# Altium footprint library Connectors THD.PcbLib: 631 footprints (part 27 of 46)
Each footprint in its own frame and in the unit in brackets; x right, y up, seen from the top. Pads: shape width x height; smd on the part's side, far side on the other; paste and mask are expansions set on the pad; w line width, h text height; cw(c..) or ccw(c..) is an arc to the next point about the centre after c.
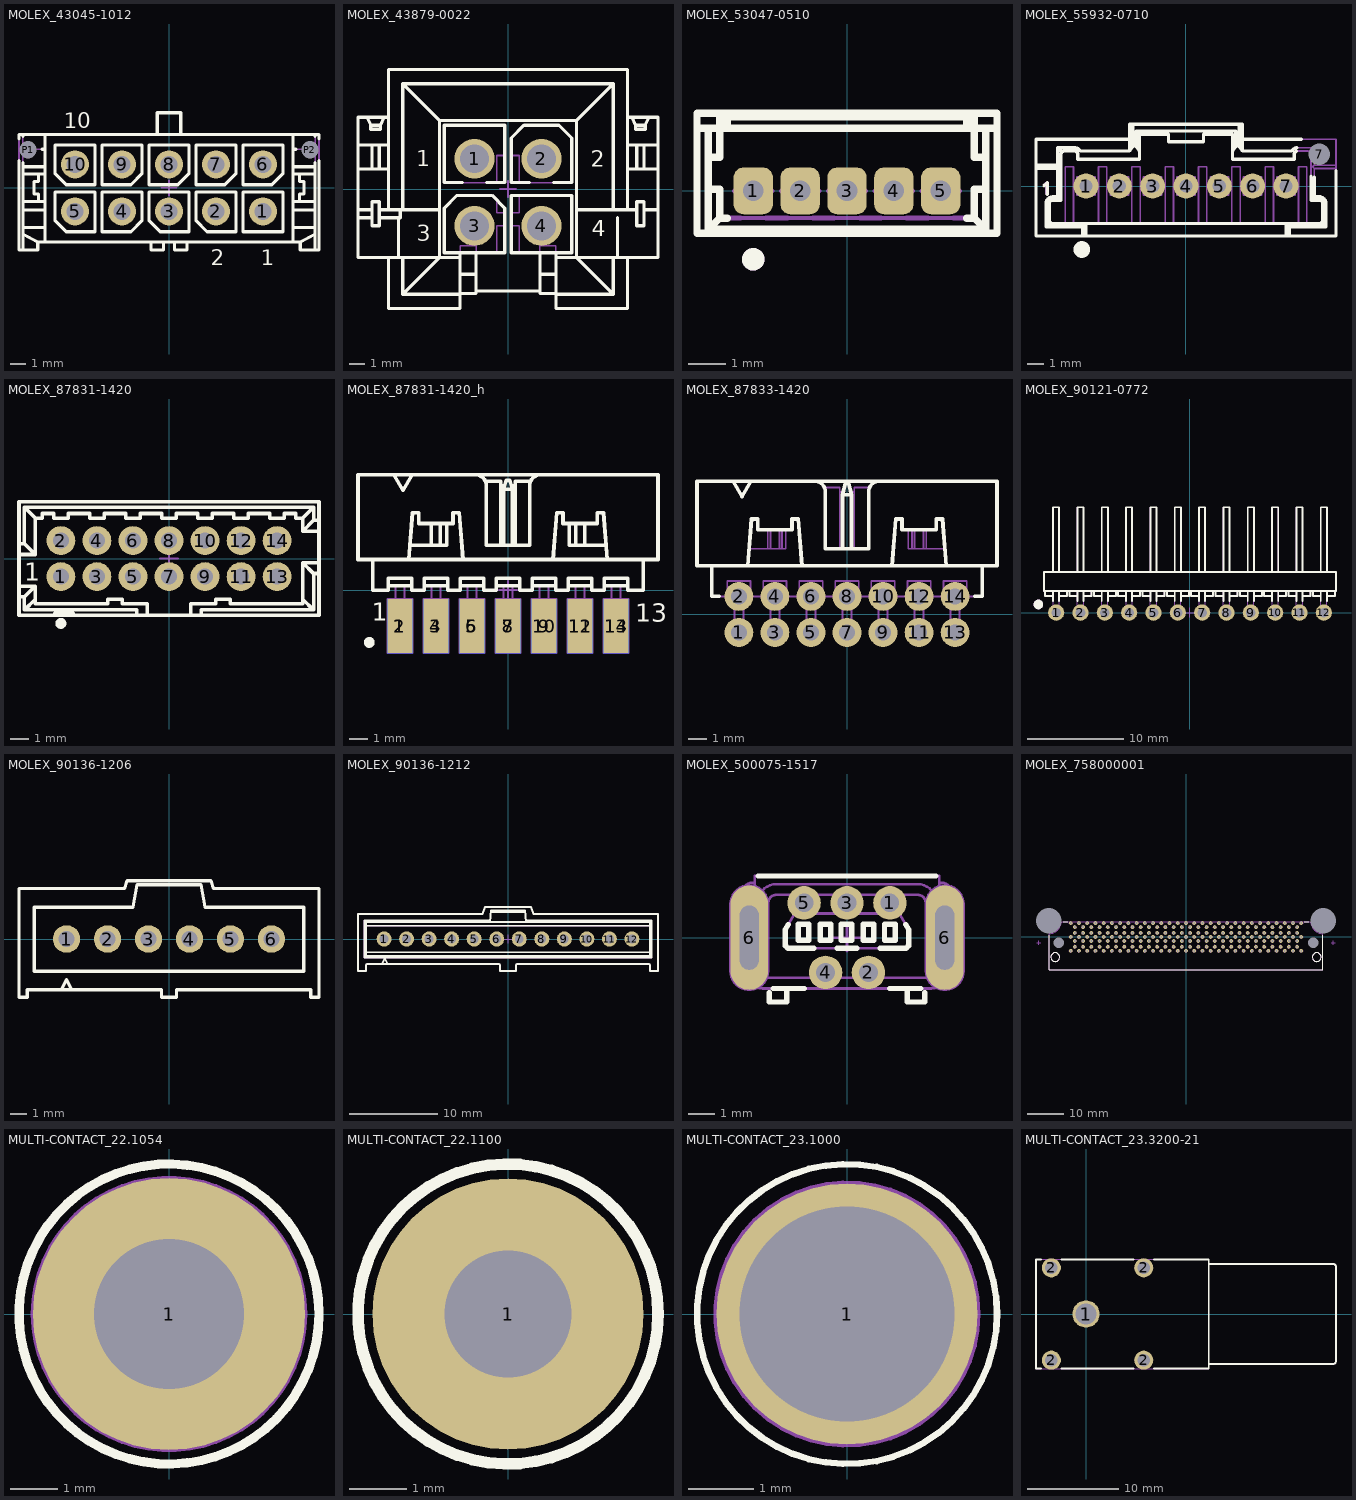
[diagram p26: the footprints below, top view; thin cyan lines are the x and y axes]

## MOLEX_43045-1012 [mm] "3.00mm (.118\") Pitch Micro-Fit 3.0™ Header, Dual Row, Vertical, with PCB Polarizing Peg, 10 Circuits"
height 9.91
pads (12):
  round 1.8 hole 1.1: 1(6,-1.5) 2(3,-1.5) 3(0,-1.5) 4(-3,-1.5) 5(-6,-1.5) 6(6,1.5) 7(3,1.5) 8(0,1.5) 9(-3,1.5) 10(-6,1.5)
  round 1 hole 1.1 unplated mask+0.05: P1(-9,2.44) P2(9,2.44)
Top Overlay:
  lines w0.2: -9.575,1.748 -9.575,-3.97 -8.375,-3.97 -8.375,-3.46 ; -9.575,3.132 -9.575,3.4 9.575,3.4 9.575,3.132 ; -9.325,-3.97 -9.325,1.601 ; -9.325,-2.96 -8.375,-3.46 ; -9.325,-2.53 -7.925,-2.53 -7.925,-1.405 -9.325,-1.405 ; -9.325,-0.875 -7.925,-0.875 ; -9.325,0.875 -7.925,0.875 ; -9.325,1.345 -7.925,1.345 ; -9.325,3.279 -9.325,3.4 ; -8.325,-0.875 -8.325,-0.4 -8.625,-0.4 -8.625,0.4 -8.325,0.4 -8.325,0.875 ; -8.101,2.47 -7.925,2.47 ; -7.925,-3.46 -7.925,3.4 ; -1.15,-3.46 -1.15,-3.97 -0.35,-3.97 -0.35,-3.46 ; -0.75,3.4 -0.75,4.8 0.75,4.8 0.75,3.4 ; 0.35,-3.46 0.35,-3.97 1.15,-3.97 1.15,-3.46 ; 7.925,-3.46 7.925,3.4 ; 7.925,-2.53 9.325,-2.53 ; 7.925,-1.405 9.325,-1.405 ; 7.925,-0.875 9.325,-0.875 ; 7.925,0.875 9.325,0.875 ; 7.925,1.345 9.325,1.345 ; 7.925,2.47 8.101,2.47 ; 8.325,-0.875 8.325,-0.4 8.625,-0.4 8.625,0.4 8.325,0.4 8.325,0.875 ; 9.325,-3.97 9.325,1.601 ; 9.325,-2.96 8.375,-3.46 ; 9.325,3.279 9.325,3.4 ; 9.575,1.748 9.575,-3.97 8.375,-3.97 8.375,-3.46 ; -8.375,-3.46 8.375,-3.46 ; -7.27,-2.1 -6.57,-2.8 -4.73,-2.8 -4.73,-0.26 -7.27,-0.26 -7.27,-2.1 ; -7.27,0.9 -6.57,0.2 -4.73,0.2 -4.73,2.74 -7.27,2.74 -7.27,0.9 ; -4.27,-2.8 -2.43,-2.8 -1.73,-2.1 -1.73,-0.26 -4.27,-0.26 -4.27,-2.8 ; -4.27,0.2 -2.43,0.2 -1.73,0.9 -1.73,2.74 -4.27,2.74 -4.27,0.2 ; -1.27,-2.1 -0.57,-2.8 1.27,-2.8 1.27,-0.26 -1.27,-0.26 -1.27,-2.1 ; -1.27,0.2 0.57,0.2 1.27,0.9 1.27,2.74 -1.27,2.74 -1.27,0.2 ; 1.73,-2.1 2.43,-2.8 4.27,-2.8 4.27,-0.26 1.73,-0.26 1.73,-2.1 ; 1.73,0.2 3.57,0.2 4.27,0.9 4.27,2.74 1.73,2.74 1.73,0.2 ; 4.73,-2.8 7.27,-2.8 7.27,-0.26 4.73,-0.26 4.73,-2.8 ; 4.73,0.2 4.73,2.74 7.27,2.74 7.27,0.9 6.57,0.2 4.73,0.2
  text "10" at -6.731,3.81 h1
  text "1" at 5.842,-4.953 h1
  text "2" at 2.667,-4.953 h1
Mechanical 8:
  lines w0.1: -9.5,2.44 -9,2.44 ; -9,1.94 -9,2.44 ; -9,2.94 -9,2.44 ; -8.5,2.44 -9,2.44 ; -6.5,-1.5 -6,-1.5 ; -6.5,1.5 -6,1.5 ; -6,-2 -6,-1.5 ; -6,-1 -6,-1.5 ; -6,1 -6,1.5 ; -6,2 -6,1.5 ; -5.5,-1.5 -6,-1.5 ; -5.5,1.5 -6,1.5 ; -3.5,-1.5 -3,-1.5 ; -3.5,1.5 -3,1.5 ; -3,-2 -3,-1.5 ; -3,-1 -3,-1.5 ; -3,1 -3,1.5 ; -3,2 -3,1.5 ; -2.5,-1.5 -3,-1.5 ; -2.5,1.5 -3,1.5 ; -0.5,-1.5 0,-1.5 ; -0.5,0 0,0 ; -0.5,1.5 0,1.5 ; 0,-2 0,-1.5 ; 0,-1 0,-1.5 ; 0,-0.5 0,0 ; 0,0.5 0,0 ; 0,1 0,1.5 ; 0,2 0,1.5 ; 0.5,-1.5 0,-1.5 ; 0.5,0 0,0 ; 0.5,1.5 0,1.5 ; 2.5,-1.5 3,-1.5 ; 2.5,1.5 3,1.5 ; 3,-2 3,-1.5 ; 3,-1 3,-1.5 ; 3,1 3,1.5 ; 3,2 3,1.5 ; 3.5,-1.5 3,-1.5 ; 3.5,1.5 3,1.5 ; 5.5,-1.5 6,-1.5 ; 5.5,1.5 6,1.5 ; 6,-2 6,-1.5 ; 6,-1 6,-1.5 ; 6,1 6,1.5 ; 6,2 6,1.5 ; 6.5,-1.5 6,-1.5 ; 6.5,1.5 6,1.5 ; 8.5,2.44 9,2.44 ; 9,1.94 9,2.44 ; 9,2.94 9,2.44 ; 9.5,2.44 9,2.44
Mechanical 14:
  lines w0.1: -9.325,-3.97 -9.325,3.4 ; -9.325,-2.96 -8.375,-3.46 ; -9.325,-2.53 -7.925,-2.53 -7.925,-1.405 -9.325,-1.405 ; -9.325,-0.875 -7.925,-0.875 ; -9.325,0.875 -7.925,0.875 ; -9.325,1.345 -7.925,1.345 ; -9.325,2.47 -7.925,2.47 ; -8.325,-0.875 -8.325,-0.4 -8.625,-0.4 -8.625,0.4 -8.325,0.4 -8.325,0.875 ; -7.925,-3.46 -7.925,3.4 ; -1.15,-3.46 -1.15,-3.97 -0.35,-3.97 -0.35,-3.46 ; -0.75,3.4 -0.75,4.8 0.75,4.8 0.75,3.4 ; 0.35,-3.46 0.35,-3.97 1.15,-3.97 1.15,-3.46 ; 7.925,-3.46 7.925,3.4 ; 7.925,-2.53 9.325,-2.53 ; 7.925,-1.405 9.325,-1.405 ; 7.925,-0.875 9.325,-0.875 ; 7.925,0.875 9.325,0.875 ; 7.925,1.345 9.325,1.345 ; 7.925,2.47 9.325,2.47 ; 8.325,-0.875 8.325,-0.4 8.625,-0.4 8.625,0.4 8.325,0.4 8.325,0.875 ; 9.325,-3.97 9.325,3.4 ; 9.325,-2.96 8.375,-3.46 ; -8.375,-3.46 -8.375,-3.97 -9.575,-3.97 -9.575,3.4 9.575,3.4 9.575,-3.97 8.375,-3.97 8.375,-3.46 ; -8.375,-3.46 8.375,-3.46 ; -7.27,-2.1 -7.27,-0.26 -4.73,-0.26 -4.73,-2.8 -6.57,-2.8 -7.27,-2.1 ; -7.27,0.9 -7.27,2.74 -4.73,2.74 -4.73,0.2 -6.57,0.2 -7.27,0.9 ; -4.27,-2.8 -4.27,-0.26 -1.73,-0.26 -1.73,-2.1 -2.43,-2.8 -4.27,-2.8 ; -4.27,0.2 -4.27,2.74 -1.73,2.74 -1.73,0.9 -2.43,0.2 -4.27,0.2 ; -1.27,-2.1 -1.27,-0.26 1.27,-0.26 1.27,-2.8 -0.57,-2.8 -1.27,-2.1 ; -1.27,0.2 -1.27,2.74 1.27,2.74 1.27,0.9 0.57,0.2 -1.27,0.2 ; 1.73,-2.1 1.73,-0.26 4.27,-0.26 4.27,-2.8 2.43,-2.8 1.73,-2.1 ; 1.73,0.2 1.73,2.74 4.27,2.74 4.27,0.9 3.57,0.2 1.73,0.2 ; 4.73,-2.8 4.73,-0.26 7.27,-0.26 7.27,-2.8 4.73,-2.8 ; 4.73,0.2 6.57,0.2 7.27,0.9 7.27,2.74 4.73,2.74 4.73,0.2
  text "1" at 5.842,-4.953 h1
  text "10" at -6.731,3.81 h1
  text "2" at 2.667,-4.953 h1
3D body: height 9.91, standoff -3.18, extent -9.575,-3.97 9.575,4.8

## MOLEX_43879-0022 [mm] "4.20mm Pitch, Mini-Fit® CPI (Compliant Pin Interface) 4 Circuits Dual Row Vertical Header"
height 14.9
pads (4):
  round 2.5 hole 1.8: 1(-2.1,1.9) 2(2.1,1.9) 3(-2.1,-2.314) 4(2.1,-2.314)
Top Overlay:
  lines w0.2: -9.405,-1.8 -8.525,-1.8 ; -9.405,-1.3 -8.525,-1.3 ; -9.405,1.25 -7.5,1.25 ; -9.405,2.75 -7.5,2.75 ; -8.833,4.5 -8.6,4.001 ; -8.525,1.25 -8.525,2.75 ; -8.075,-1.8 -6.755,-1.8 -6.755,-1.3 ; -8.075,-1.3 -4.3,-1.3 ; -8.075,1.25 -8.075,2.75 ; -7.767,4.5 -8,4.001 ; -7.5,-4.3 -7.5,-7.5 -3,-7.5 -3,-4 ; -7.5,-1.3 -7.5,7.5 7.5,7.5 7.5,-1.3 ; -7.5,4.5 -9.405,4.5 -9.405,-4.3 -3,-4.3 ; -6.86,-4.3 -6.86,-1.8 ; -6.6,-4.3 -6.6,-6.6 ; -6.6,-1.3 -6.6,6.6 ; -3,-6.6 -6.6,-6.6 ; -3,-6.55 -2,-6.55 -2,-4 ; -3,-5.35 -2,-5.35 ; -2.845,0.4 -4,0.4 -4,4 -0.2,4 -0.2,0.4 -1.355,0.4 ; -2,-6.4 2,-6.4 ; 1.355,0.4 0.2,0.4 0.2,3.2 1,4 3.2,4 4,3.2 4,0.4 2.845,0.4 ; 2,-5.35 3,-5.35 ; 2,-3.986 2,-6.55 3,-6.55 ; 3,-6.6 6.6,-6.6 ; 3,-4.3 9.405,-4.3 9.405,4.5 7.5,4.5 ; 3,-4 3,-7.5 7.5,-7.5 7.5,-4.3 ; 4.3,-1.3 8.075,-1.3 ; 6.6,-4.3 6.6,-6.6 ; 6.6,-1.3 6.6,6.6 ; 6.86,-4.3 6.86,-1.8 ; 7.5,1.25 9.405,1.25 ; 7.5,2.75 9.405,2.75 ; 7.767,4.5 8,4.001 ; 8.075,1.25 8.075,2.75 ; 8.525,-1.3 9.405,-1.3 ; 8.525,1.25 8.525,2.75 ; 8.833,4.5 8.6,4 ; -8.6,4.001 -8,4.001 ; -8.6,4.001 -8.6,3.75 -8,3.75 -8,4.001 ; -6.6,-6.6 -4.3,-4.3 -4.3,4.3 ; -6.6,6.6 -4.3,4.3 ; -6.6,6.6 6.6,6.6 ; -4.3,4.3 4.3,4.3 ; 4.3,4.3 6.6,6.6 ; 4.3,4.3 4.3,-4.3 6.6,-6.6 ; 8,4.001 8.6,4 ; 8,4.001 8,3.75 8.6,3.75 8.6,4.001 ; -8.525,-2.3 -8.075,-2.3 -8.075,-0.8 -8.525,-0.8 -8.525,-2.3 ; -4,-4 -4,-1.2 -3.2,-0.4 -1,-0.4 -0.2,-1.2 -0.2,-4 -4,-4 ; 0.2,-4 4,-4 4,-0.4 0.2,-0.4 0.2,-4 ; 8.075,-2.3 8.525,-2.3 8.525,-0.8 8.075,-0.8 8.075,-2.3
  text "1" at -5.767,1.432 h1
  text "4" at 5.242,-2.975 h1
  text "2" at 5.192,1.386 h1
  text "3" at -5.733,-3.289 h1
Mechanical 8:
  lines w0.1: -2.6,-2.314 -2.1,-2.314 ; -2.6,1.9 -2.1,1.9 ; -2.1,-2.814 -2.1,-2.314 ; -2.1,-1.814 -2.1,-2.314 ; -2.1,1.4 -2.1,1.9 ; -2.1,2.4 -2.1,1.9 ; -1.6,-2.314 -2.1,-2.314 ; -1.6,1.9 -2.1,1.9 ; -0.5,0 0,0 ; 0,-0.5 0,0 ; 0,0.5 0,0 ; 0.5,0 0,0 ; 1.6,-2.314 2.1,-2.314 ; 1.6,1.9 2.1,1.9 ; 2.1,-2.814 2.1,-2.314 ; 2.1,-1.814 2.1,-2.314 ; 2.1,1.4 2.1,1.9 ; 2.1,2.4 2.1,1.9 ; 2.6,-2.314 2.1,-2.314 ; 2.6,1.9 2.1,1.9
Mechanical 14:
  lines w0.1: -9.405,-1.8 -8.525,-1.8 ; -9.405,-1.3 -8.525,-1.3 ; -9.405,1.25 -7.5,1.25 ; -9.405,2.75 -7.5,2.75 ; -8.833,4.5 -8.6,4.001 ; -8.525,1.25 -8.525,2.75 ; -8.075,-1.8 -6.755,-1.8 -6.755,-1.3 ; -8.075,-1.3 -4.3,-1.3 ; -8.075,1.25 -8.075,2.75 ; -7.767,4.5 -8,4.001 ; -7.5,-4.3 -7.5,-7.5 -3,-7.5 -3,-3.55 -2,-3.55 -2,-6.55 -3,-6.55 ; -7.5,-1.3 -7.5,7.5 7.5,7.5 7.5,-1.3 ; -7.5,4.5 -9.405,4.5 -9.405,-4.3 -3,-4.3 ; -6.86,-4.3 -6.86,-1.8 ; -6.6,-4.3 -6.6,-6.6 ; -6.6,-1.3 -6.6,6.6 ; -3,-6.6 -6.6,-6.6 ; -3,-5.35 -2,-5.35 ; -2,-6.4 2,-6.4 ; -0.7,-4 -0.7,-2.3 -0.2,-2.3 ; -0.7,-0.7 -0.7,-1.5 -0.2,-1.5 ; -0.7,0.4 -0.7,2.1 -0.2,2.1 ; 0.2,-3.96 0.7,-3.96 0.7,-2.3 0.2,-2.3 ; 0.2,-1.5 0.7,-1.5 0.7,-0.4 ; 0.2,2.1 0.7,2.1 0.7,0.4 ; 2,-5.35 3,-5.35 ; 3,-6.6 6.6,-6.6 ; 3,-6.55 2,-6.55 2,-3.55 3,-3.55 3,-7.5 7.5,-7.5 7.5,-4.3 ; 3,-4.3 9.405,-4.3 9.405,4.5 7.5,4.5 ; 4.3,-1.3 8.075,-1.3 ; 6.6,-4.3 6.6,-6.6 ; 6.6,-1.3 6.6,6.6 ; 6.86,-4.3 6.86,-1.8 ; 7.5,1.25 9.405,1.25 ; 7.5,2.75 9.405,2.75 ; 7.767,4.5 8,4.001 ; 8.075,1.25 8.075,2.75 ; 8.525,-1.3 9.405,-1.3 ; 8.525,1.25 8.525,2.75 ; 8.833,4.5 8.6,4 ; -8.6,4.001 -8,4.001 ; -8.6,4.001 -8.6,3.75 -8,3.75 -8,4.001 ; -6.6,-6.6 -4.3,-4.3 -4.3,4.3 ; -6.6,6.6 -4.3,4.3 ; -6.6,6.6 6.6,6.6 ; -4.3,4.3 4.3,4.3 ; 4.3,4.3 6.6,6.6 ; 4.3,4.3 4.3,-4.3 6.6,-6.6 ; 8,4.001 8.6,4 ; 8,4.001 8,3.75 8.6,3.75 8.6,4.001 ; -8.525,-2.3 -8.075,-2.3 -8.075,-0.8 -8.525,-0.8 -8.525,-2.3 ; -4,-4 -4,-1.2 -3.2,-0.4 -1,-0.4 -0.2,-1.2 -0.2,-4 -4,-4 ; -4,0.4 -0.2,0.4 -0.2,4 -4,4 -4,0.4 ; -2.475,-2.675 -1.725,-2.675 -1.725,-1.925 -2.475,-1.925 -2.475,-2.675 ; -2.475,1.525 -1.725,1.525 -1.725,2.275 -2.475,2.275 -2.475,1.525 ; 0.2,-4 4,-4 4,-0.4 0.2,-0.4 0.2,-4 ; 0.2,0.4 0.2,3.2 1,4 3.2,4 4,3.2 4,0.4 0.2,0.4 ; 1.725,-2.675 2.475,-2.675 2.475,-1.925 1.725,-1.925 1.725,-2.675 ; 1.725,1.525 2.475,1.525 2.475,2.275 1.725,2.275 1.725,1.525 ; 8.075,-2.3 8.525,-2.3 8.525,-0.8 8.075,-0.8 8.075,-2.3
  text "1" at -5.767,1.432 h1
  text "4" at 5.242,-2.975 h1
  text "2" at 5.192,1.386 h1
  text "3" at -5.733,-3.289 h1
Drill Drawing:
  lines w0.1: -4,-4 -4,4 4,4 4,-4 -4,-4
  text "PRESS-FIT TECHNOLOGY" at -8.275,6.075 h1
  text "diam. 1.8mm +0.1 -0.05" at -8.9,4.4 h1
3D body: height 14.9, standoff -5.82, extent -9.405,-7.5 9.405,7.5

## MOLEX_53047-0510 [mm] "1.25mm Pitch PicoBlade™ Wire-to-Board 5 Circuits Vertical Header with Friction Lock"
height 4.2
pads (5):
  rrect50% 1.05x1.25 hole 0.55: 1(-2.5,0) 2(-1.25,0) 3(0,0) 4(1.25,0) 5(2.5,0)
Top Overlay:
  circle w0.3: c-2.5,-1.825 r0.15
  lines w0.2: -4,1.675 4,1.675 ; -3.7,0.05 -3.4,0.05 -3.4,-0.725 ; -3.7,0.9 -3.4,0.9 -3.4,1.975 3.4,1.975 3.4,0.9 3.7,0.9 ; -3.7,1.675 -3.7,-1.025 ; -3.2,-0.725 -3.4,-0.725 ; -3.2,1.675 -3.2,2.075 ; 3.2,-0.725 3.4,-0.725 ; 3.2,1.675 3.2,2.075 ; 3.7,0.05 3.4,0.05 3.4,-0.725 ; 3.7,1.675 3.7,-1.025 ; -3.7,-1.025 -3.4,-0.725 ; -3.7,-1.025 3.7,-1.025 ; 3.4,-0.725 3.7,-1.025 ; -4,-1.125 -4,2.075 4,2.075 4,-1.125 -4,-1.125
Mechanical 3:
  lines w0.127: -3,0 -2.5,0 ; -2.5,-0.5 -2.5,0 ; -2.5,0.5 -2.5,0 ; -2,0 -2.5,0 ; -1.75,0 -1.25,0 ; -1.25,-0.5 -1.25,0 ; -1.25,0.5 -1.25,0 ; -0.75,0 -1.25,0 ; -0.5,0 0,0 ; 0,-0.5 0,0 ; 0,0.5 0,0 ; 0.5,0 0,0 ; 0.75,0 1.25,0 ; 1.25,-0.5 1.25,0 ; 1.75,0 1.25,0 ; 2,0 2.5,0 ; 2.5,-0.5 2.5,0 ; 2.5,0.5 2.5,0 ; 3,0 2.5,0 ; 1.25,0 1.25,0.5 1.25,0
Mechanical 4:
  lines w0.127: -4,1.675 4,1.675 ; -3.7,0.05 -3.4,0.05 -3.4,-0.725 ; -3.7,0.9 -3.4,0.9 -3.4,1.975 3.4,1.975 3.4,0.9 3.7,0.9 ; -3.7,1.675 -3.7,-1.025 ; -3.2,1.675 -3.2,2.075 ; -2.838,-0.725 -3.4,-0.725 ; -2.162,-0.725 -1.588,-0.725 ; -0.912,-0.725 -0.338,-0.725 ; 0.338,-0.725 0.912,-0.725 ; 1.588,-0.725 2.162,-0.725 ; 2.838,-0.725 3.4,-0.725 ; 3.2,1.675 3.2,2.075 ; 3.7,0.05 3.4,0.05 3.4,-0.725 ; 3.7,1.675 3.7,-1.025 ; -3.7,-1.025 -3.4,-0.725 ; -3.7,-1.025 3.7,-1.025 ; 3.4,-0.725 3.7,-1.025 ; -4,-1.125 -4,2.075 4,2.075 4,-1.125 -4,-1.125
Mechanical 8:
  lines w0.1: -3,0 -2.5,0 ; -2.5,-0.5 -2.5,0 ; -2.5,0.5 -2.5,0 ; -2,0 -2.5,0 ; -1.75,0 -1.25,0 ; -1.25,-0.5 -1.25,0 ; -1.25,0.5 -1.25,0 ; -0.75,0 -1.25,0 ; -0.5,0 0,0 ; 0,-0.5 0,0 ; 0,0.5 0,0 ; 0.5,0 0,0 ; 0.75,0 1.25,0 ; 1.25,-0.5 1.25,0 ; 1.75,0 1.25,0 ; 2,0 2.5,0 ; 2.5,-0.5 2.5,0 ; 2.5,0.5 2.5,0 ; 3,0 2.5,0 ; 1.25,0 1.25,0.5 1.25,0
Mechanical 14:
  circle w0.3: c-2.5,-1.825 r0.15
  lines w0.1: -4,1.675 4,1.675 ; -3.7,0.05 -3.4,0.05 -3.4,-0.725 ; -3.7,0.9 -3.4,0.9 -3.4,1.975 3.4,1.975 3.4,0.9 3.7,0.9 ; -3.7,1.675 -3.7,-1.025 ; -3.2,1.675 -3.2,2.075 ; 3.2,1.675 3.2,2.075 ; 3.7,0.05 3.4,0.05 3.4,-0.725 ; 3.7,1.675 3.7,-1.025 ; -3.7,-1.025 -3.4,-0.725 ; -3.7,-1.025 3.7,-1.025 ; -3.4,-0.725 3.4,-0.725 ; -2.66,-0.35 -2.525,-0.225 ; -2.66,-0.35 -2.66,0.35 ; -2.66,-0.35 -2.34,-0.35 ; -2.66,0.35 -2.525,0.225 ; -2.66,0.35 -2.34,0.35 ; -2.525,-0.225 -2.525,0.225 ; -2.525,-0.225 -2.475,-0.225 ; -2.525,0.225 -2.475,0.225 ; -2.475,-0.225 -2.34,-0.35 ; -2.475,-0.225 -2.475,0.225 ; -2.475,0.225 -2.34,0.35 ; -2.34,-0.35 -2.34,0.35 ; -1.41,-0.35 -1.275,-0.225 ; -1.41,-0.35 -1.41,0.35 ; -1.41,-0.35 -1.09,-0.35 ; -1.41,0.35 -1.275,0.225 ; -1.41,0.35 -1.09,0.35 ; -1.275,-0.225 -1.275,0.225 ; -1.275,-0.225 -1.225,-0.225 ; -1.275,0.225 -1.225,0.225 ; -1.225,-0.225 -1.09,-0.35 ; -1.225,-0.225 -1.225,0.225 ; -1.225,0.225 -1.09,0.35 ; -1.09,-0.35 -1.09,0.35 ; -0.16,-0.35 -0.025,-0.225 ; -0.16,-0.35 -0.16,0.35 ; -0.16,-0.35 0.16,-0.35 ; -0.16,0.35 -0.025,0.225 ; -0.16,0.35 0.16,0.35 ; -0.025,-0.225 -0.025,0.225 ; -0.025,-0.225 0.025,-0.225 ; -0.025,0.225 0.025,0.225 ; 0.025,-0.225 0.16,-0.35 ; 0.025,-0.225 0.025,0.225 ; 0.025,0.225 0.16,0.35 ; 0.16,-0.35 0.16,0.35 ; 1.09,-0.35 1.225,-0.225 ; 1.09,-0.35 1.09,0.35 ; 1.09,-0.35 1.41,-0.35 ; 1.09,0.35 1.225,0.225 ; 1.09,0.35 1.41,0.35 ; 1.225,-0.225 1.225,0.225 ; 1.225,-0.225 1.275,-0.225 ; 1.225,0.225 1.275,0.225 ; 1.275,-0.225 1.41,-0.35 ; 1.275,-0.225 1.275,0.225 ; 1.275,0.225 1.41,0.35 ; 1.41,-0.35 1.41,0.35 ; 2.34,-0.35 2.475,-0.225 ; 2.34,-0.35 2.34,0.35 ; 2.34,-0.35 2.66,-0.35 ; 2.34,0.35 2.475,0.225 ; 2.34,0.35 2.66,0.35 ; 2.475,-0.225 2.475,0.225 ; 2.475,-0.225 2.525,-0.225 ; 2.475,0.225 2.525,0.225 ; 2.525,-0.225 2.66,-0.35 ; 2.525,-0.225 2.525,0.225 ; 2.525,0.225 2.66,0.35 ; 2.66,-0.35 2.66,0.35 ; 3.4,-0.725 3.7,-1.025 ; -4,-1.125 -4,2.075 4,2.075 4,-1.125 -4,-1.125
3D body: height 4.2, standoff -2.2, extent -4,-1.125 4,2.075

## MOLEX_55932-0710 [mm] "2.00mm Pitch MicroClasp Wire-to-Board Header, Single Row, Vertical, 7 Circuits, with PCB Locator"
height 9.75
pads (8):
  round 1.5 hole 0.8: 1(-6,0) 2(-4,0) 3(-2,0) 4(0,0) 5(2,0) 6(4,0) 7(6,0)
  round 1 hole 1.3 unplated mask+0.15: 7(8,1.9)
Top Overlay:
  circle w0.5: c-6.25,-3.81 r0.25
  lines w0.2: -9,1.05 -7.7,1.05 ; -9,1.25 -7.7,1.25 ; -8.524,0.001 -8.325,0.2 -8.325,-0.5 ; -8.2,-2.05 ccw(c-8,-2.05) -8,-2.25 ; -7.6,1.15 -7.7,1.25 ; -7.5,1.25 -7.7,1.05 ; -7.441,2.041 -7.7,2.3 ; -6.2,-3 -6.2,-2.45 ; -6,-3 -6,-2.25 ; -3.39,2.8 -9,2.8 -9,-3 9,-3 9,0.92 ; -3.19,3.7 -3.19,2.4 ; -2.79,2.1 -2.99,2.4 ; 2.79,2.1 2.99,2.4 ; 3.19,3.7 3.19,2.4 ; 3.39,2.8 6.928,2.8 ; 6,-3 6,-2.25 ; 6.2,-3 6.2,-2.45 ; 6.612,2.079 ccw(c6.7,1.9) 6.5,1.9 6.5,1.6 2.79,1.6 2.79,3.1 1.05,3.1 1.05,2.65 -1.05,2.65 -1.05,3.1 -2.79,3.1 ; 6.658,2.298 ccw(c6.7,1.9) 6.354,2.1 3.39,2.1 ; 7.5,0.592 7.5,-0.85 ; 7.7,0.533 7.7,-0.65 ; 8,-2.25 ccw(c8,-2.05) 8.2,-2.05 ; -8.4,-2.45 -6.2,-2.45 ; -8.4,-2.45 -8.2,-2.25 ; -8.4,-2.45 -8.4,-1.05 ; -8.4,-1.05 cw(c-8,-1.05) -8,-0.65 ; -8.4,-1.05 -8.2,-1.05 ; -8.2,-2.25 -6,-2.25 ; -8.2,-2.25 -8.2,-1.05 ; -8.2,-1.05 cw(c-8,-1.05) -8,-0.85 ; -8,-0.85 -7.5,-0.85 ; -8,-0.85 -8,-0.65 ; -8,-0.65 -7.7,-0.65 ; -7.7,-0.65 -7.5,-0.85 ; -7.7,-0.65 -7.7,1.05 ; -7.7,1.25 -7.7,2.3 ; -7.7,2.3 -6.7,2.3 cw(c-6.7,1.9) -6.354,2.1 -3.39,2.1 ; -7.5,-0.85 -7.5,1.9 cw(c-7.3,1.9) -7.3,2.1 -6.7,2.1 cw(c-6.7,1.9) -6.5,1.9 -6.5,1.6 -2.79,1.6 -2.79,3.1 ; -6.2,-2.45 -6,-2.25 ; -6,-2.25 6,-2.25 ; -3.39,2.1 -3.39,3.7 3.39,3.7 3.39,2.1 ; -3.39,2.1 -3.19,2.4 ; -3.19,2.4 -2.99,2.4 ; -2.99,2.4 -2.99,3.3 ; -2.99,3.3 -2.79,3.1 ; -2.99,3.3 2.99,3.3 2.99,2.4 ; 2.99,2.4 3.19,2.4 ; 3.19,2.4 3.39,2.1 ; 6,-2.25 8.2,-2.25 ; 6,-2.25 6.2,-2.45 ; 6.2,-2.45 8.4,-2.45 ; 7.5,-0.85 8,-0.85 ; 7.5,-0.85 7.7,-0.65 ; 7.7,-0.65 8,-0.65 ; 8,-0.85 cw(c8,-1.05) 8.2,-1.046 ccw(c8,-1.05) 8,-0.85 ; 8,-0.85 8,-0.65 ; 8,-0.65 cw(c8,-1.05) 8.4,-1.05 ; 8.2,-2.25 8.2,-1.05 8.4,-1.05 ; 8.2,-2.25 8.4,-2.45 ; 8.4,-2.45 8.4,-1.05
Mechanical 8:
  lines w0.1: -6.5,0 -6,0 ; -6,-0.5 -6,0 ; -6,0.5 -6,0 ; -5.5,0 -6,0 ; -4.5,0 -4,0 ; -4,-0.5 -4,0 ; -4,0.5 -4,0 ; -3.5,0 -4,0 ; -2.5,0 -2,0 ; -2,-0.5 -2,0 ; -2,0.5 -2,0 ; -1.5,0 -2,0 ; -0.5,0 0,0 ; 0,-0.5 0,0 ; 0,0.5 0,0 ; 0.5,0 0,0 ; 1.5,0 2,0 ; 2,-0.5 2,0 ; 2,0.5 2,0 ; 2.5,0 2,0 ; 3.5,0 4,0 ; 4,-0.5 4,0 ; 4,0.5 4,0 ; 4.5,0 4,0 ; 5.5,0 6,0 ; 6,-0.5 6,0 ; 6,0.5 6,0 ; 6.5,0 6,0 ; 7.5,1.9 8,1.9 ; 8,1.4 8,1.9 ; 8,2.4 8,1.9 ; 8.5,1.9 8,1.9
Mechanical 14:
  drawing of 210 lines, arcs and shapes, not listed
3D body: height 9.75, standoff -3.2, extent -9,-3 9,3.7

## MOLEX_87831-1420 [mm] "2.00mm (.079\") Pitch Milli-Grid™ Header, Vertical, Shrouded, Center Polarization Slot, Locking Window, 14 Circuits"
height 6.4
pads (14):
  round 1.6 hole 0.9: 1(-6,-1) 2(-6,1) 3(-4,-1) 4(-4,1) 5(-2,-1) 6(-2,1) 7(0,-1) 8(0,1) 9(2,-1) 10(2,1) 11(4,-1) 12(4,1) 13(6,-1) 14(6,1)
Top Overlay:
  circle w0.3: c-6,-3.6 r0.15
  lines w0.2: -8.325,-2.125 -8.025,-2.125 ; -8.325,-1.525 -7.425,-1.525 ; -8.325,0.225 -7.425,0.225 ; -8.325,0.825 -8.025,0.825 ; -7.425,-2.25 -8.025,-2.85 ; -6.325,-3.15 -6.325,-3.05 -5.325,-3.05 -5.325,-3.15 ; -1.8,-3.15 -1.8,-2.85 -8.025,-2.85 ; -1.2,-3.15 -1.2,-2.497 -2.6,-2.497 -2.6,-2.25 -3.4,-2.25 -3.4,-2.5 -7.425,-2.5 -7.425,-1.525 ; 1.2,-3.15 1.2,-2.497 2.6,-2.497 2.6,-2.25 3.4,-2.25 3.4,-2.5 7.425,-2.5 7.425,-0.225 ; 1.8,-3.15 1.8,-2.85 8.025,-2.85 ; 7.425,-2.25 8.025,-2.85 ; 8.325,-0.825 8.025,-0.825 ; 8.325,-0.225 7.425,-0.225 ; 8.325,1.525 7.425,1.525 ; 8.325,2.125 8.025,2.125 ; -8.025,-2.85 -8.025,-2.125 ; -8.025,-2.125 -7.425,-1.525 ; -8.025,0.825 -8.025,2.85 ; -8.025,0.825 -7.425,0.225 ; -8.025,2.85 8.025,2.85 ; -8.025,2.85 -7.425,2.25 ; -7.425,0.225 -7.425,2.25 ; -7.425,2.25 -7.025,2.25 -7.025,2.5 -6.4,2.5 -6.4,2.25 -5.6,2.25 -5.6,2.5 -4.4,2.5 -4.4,2.25 -3.6,2.25 -3.6,2.5 -2.4,2.5 -2.4,2.25 -1.6,2.25 -1.6,2.5 -0.4,2.5 -0.4,2.25 0.4,2.25 0.4,2.5 1.6,2.5 1.6,2.25 2.4,2.25 2.4,2.5 3.6,2.5 3.6,2.25 4.4,2.25 4.4,2.5 5.6,2.5 5.6,2.25 6.4,2.25 6.4,2.5 7.025,2.5 7.025,2.25 7.425,2.25 ; 7.425,-0.225 8.025,-0.825 ; 7.425,1.525 7.425,2.25 ; 7.425,1.525 8.025,2.125 ; 7.425,2.25 8.025,2.85 ; 8.025,-2.85 8.025,-0.825 ; 8.025,2.125 8.025,2.85 ; -8.325,-3.15 8.325,-3.15 8.325,3.15 -8.325,3.15 -8.325,-3.15
  text "1" at -8.032,-1.229 h1.02
Mechanical 8:
  lines w0.1: -6.5,-1 -6,-1 ; -6.5,1 -6,1 ; -6,-1.5 -6,-1 ; -6,-0.5 -6,-1 ; -6,0.5 -6,1 ; -6,1.5 -6,1 ; -5.5,-1 -6,-1 ; -5.5,1 -6,1 ; -4.5,-1 -4,-1 ; -4.5,1 -4,1 ; -4,-1.5 -4,-1 ; -4,-0.5 -4,-1 ; -4,0.5 -4,1 ; -4,1.5 -4,1 ; -3.5,-1 -4,-1 ; -3.5,1 -4,1 ; -2.5,-1 -2,-1 ; -2.5,1 -2,1 ; -2,-1.5 -2,-1 ; -2,-0.5 -2,-1 ; -2,0.5 -2,1 ; -2,1.5 -2,1 ; -1.5,-1 -2,-1 ; -1.5,1 -2,1 ; -0.5,-1 0,-1 ; -0.5,0 0,0 ; -0.5,1 0,1 ; 0,-1.5 0,-1 ; 0,1.5 0,1 ; 0.5,-1 0,-1 ; 0.5,0 0,0 ; 0.5,1 0,1 ; 1.5,-1 2,-1 ; 1.5,1 2,1 ; 2,-1.5 2,-1 ; 2,-0.5 2,-1 ; 2,0.5 2,1 ; 2,1.5 2,1 ; 2.5,-1 2,-1 ; 2.5,1 2,1 ; 3.5,-1 4,-1 ; 3.5,1 4,1 ; 4,-1.5 4,-1 ; 4,-0.5 4,-1 ; 4,0.5 4,1 ; 4,1.5 4,1 ; 4.5,-1 4,-1 ; 4.5,1 4,1 ; 5.5,-1 6,-1 ; 5.5,1 6,1 ; 6,-1.5 6,-1 ; 6,-0.5 6,-1 ; 6,0.5 6,1 ; 6,1.5 6,1 ; 6.5,-1 6,-1 ; 6.5,1 6,1 ; 0,-1 0,-0.5 0,0 ; 0,0 0,0.5 0,1
Mechanical 14:
  lines w0.1: -8.325,-2.125 -8.025,-2.125 ; -8.325,-1.525 -7.425,-1.525 ; -8.325,0.225 -7.425,0.225 ; -8.325,0.825 -8.025,0.825 ; -7.425,-2.25 -8.025,-2.85 ; -6.325,-3.15 -6.325,-3.05 -5.325,-3.05 -5.325,-3.15 ; -1.8,-3.15 -1.8,-2.85 -8.025,-2.85 ; -1.2,-3.15 -1.2,-2.497 -2.6,-2.497 -2.6,-2.25 -3.4,-2.25 -3.4,-2.5 -7.425,-2.5 -7.425,-1.525 ; 1.2,-3.15 1.2,-2.497 2.6,-2.497 2.6,-2.25 3.4,-2.25 3.4,-2.5 7.425,-2.5 7.425,-0.225 ; 1.8,-3.15 1.8,-2.85 8.025,-2.85 ; 7.425,-2.25 8.025,-2.85 ; 8.325,-0.825 8.025,-0.825 ; 8.325,-0.225 7.425,-0.225 ; 8.325,1.525 7.425,1.525 ; 8.325,2.125 8.025,2.125 ; -8.025,-2.85 -8.025,-2.125 ; -8.025,-2.125 -7.425,-1.525 ; -8.025,0.825 -8.025,2.85 ; -8.025,0.825 -7.425,0.225 ; -8.025,2.85 8.025,2.85 ; -8.025,2.85 -7.425,2.25 ; -7.425,0.225 -7.425,2.25 ; -7.425,2.25 -7.025,2.25 -7.025,2.5 -6.4,2.5 -6.4,2.25 -5.6,2.25 -5.6,2.5 -4.4,2.5 -4.4,2.25 -3.6,2.25 -3.6,2.5 -2.4,2.5 -2.4,2.25 -1.6,2.25 -1.6,2.5 -0.4,2.5 -0.4,2.25 0.4,2.25 0.4,2.5 1.6,2.5 1.6,2.25 2.4,2.25 2.4,2.5 3.6,2.5 3.6,2.25 4.4,2.25 4.4,2.5 5.6,2.5 5.6,2.25 6.4,2.25 6.4,2.5 7.025,2.5 7.025,2.25 7.425,2.25 ; 7.425,-0.225 8.025,-0.825 ; 7.425,1.525 7.425,2.25 ; 7.425,1.525 8.025,2.125 ; 7.425,2.25 8.025,2.85 ; 8.025,-2.85 8.025,-0.825 ; 8.025,2.125 8.025,2.85 ; -8.325,-3.15 8.325,-3.15 8.325,3.15 -8.325,3.15 -8.325,-3.15 ; -6.25,-1.25 -5.75,-1.25 -5.75,-0.75 -6.25,-0.75 -6.25,-1.25 ; -6.25,0.75 -5.75,0.75 -5.75,1.25 -6.25,1.25 -6.25,0.75 ; -4.25,-1.25 -3.75,-1.25 -3.75,-0.75 -4.25,-0.75 -4.25,-1.25 ; -4.25,0.75 -3.75,0.75 -3.75,1.25 -4.25,1.25 -4.25,0.75 ; -2.25,-1.25 -1.75,-1.25 -1.75,-0.75 -2.25,-0.75 -2.25,-1.25 ; -2.25,0.75 -1.75,0.75 -1.75,1.25 -2.25,1.25 -2.25,0.75 ; -0.25,-1.25 0.25,-1.25 0.25,-0.75 -0.25,-0.75 -0.25,-1.25 ; -0.25,0.75 0.25,0.75 0.25,1.25 -0.25,1.25 -0.25,0.75 ; 1.75,-1.25 2.25,-1.25 2.25,-0.75 1.75,-0.75 1.75,-1.25 ; 1.75,0.75 2.25,0.75 2.25,1.25 1.75,1.25 1.75,0.75 ; 3.75,-1.25 4.25,-1.25 4.25,-0.75 3.75,-0.75 3.75,-1.25 ; 3.75,0.75 4.25,0.75 4.25,1.25 3.75,1.25 3.75,0.75 ; 5.75,-1.25 6.25,-1.25 6.25,-0.75 5.75,-0.75 5.75,-1.25 ; 5.75,0.75 6.25,0.75 6.25,1.25 5.75,1.25 5.75,0.75
  text "1" at -8.032,-1.229 h1.02
3D body: height 6.4, standoff -2.5, extent -8.325,-3.15 8.325,3.15
